# Altium footprint library Pi.PcbLib: 61 footprints (part 2 of 4)
Each footprint in its own frame and in the unit in brackets; x right, y up, seen from the top. Pads: shape width x height; smd on the part's side, far side on the other; paste and mask are expansions set on the pad; w line width, h text height; cw(c..) or ccw(c..) is an arc to the next point about the centre after c.
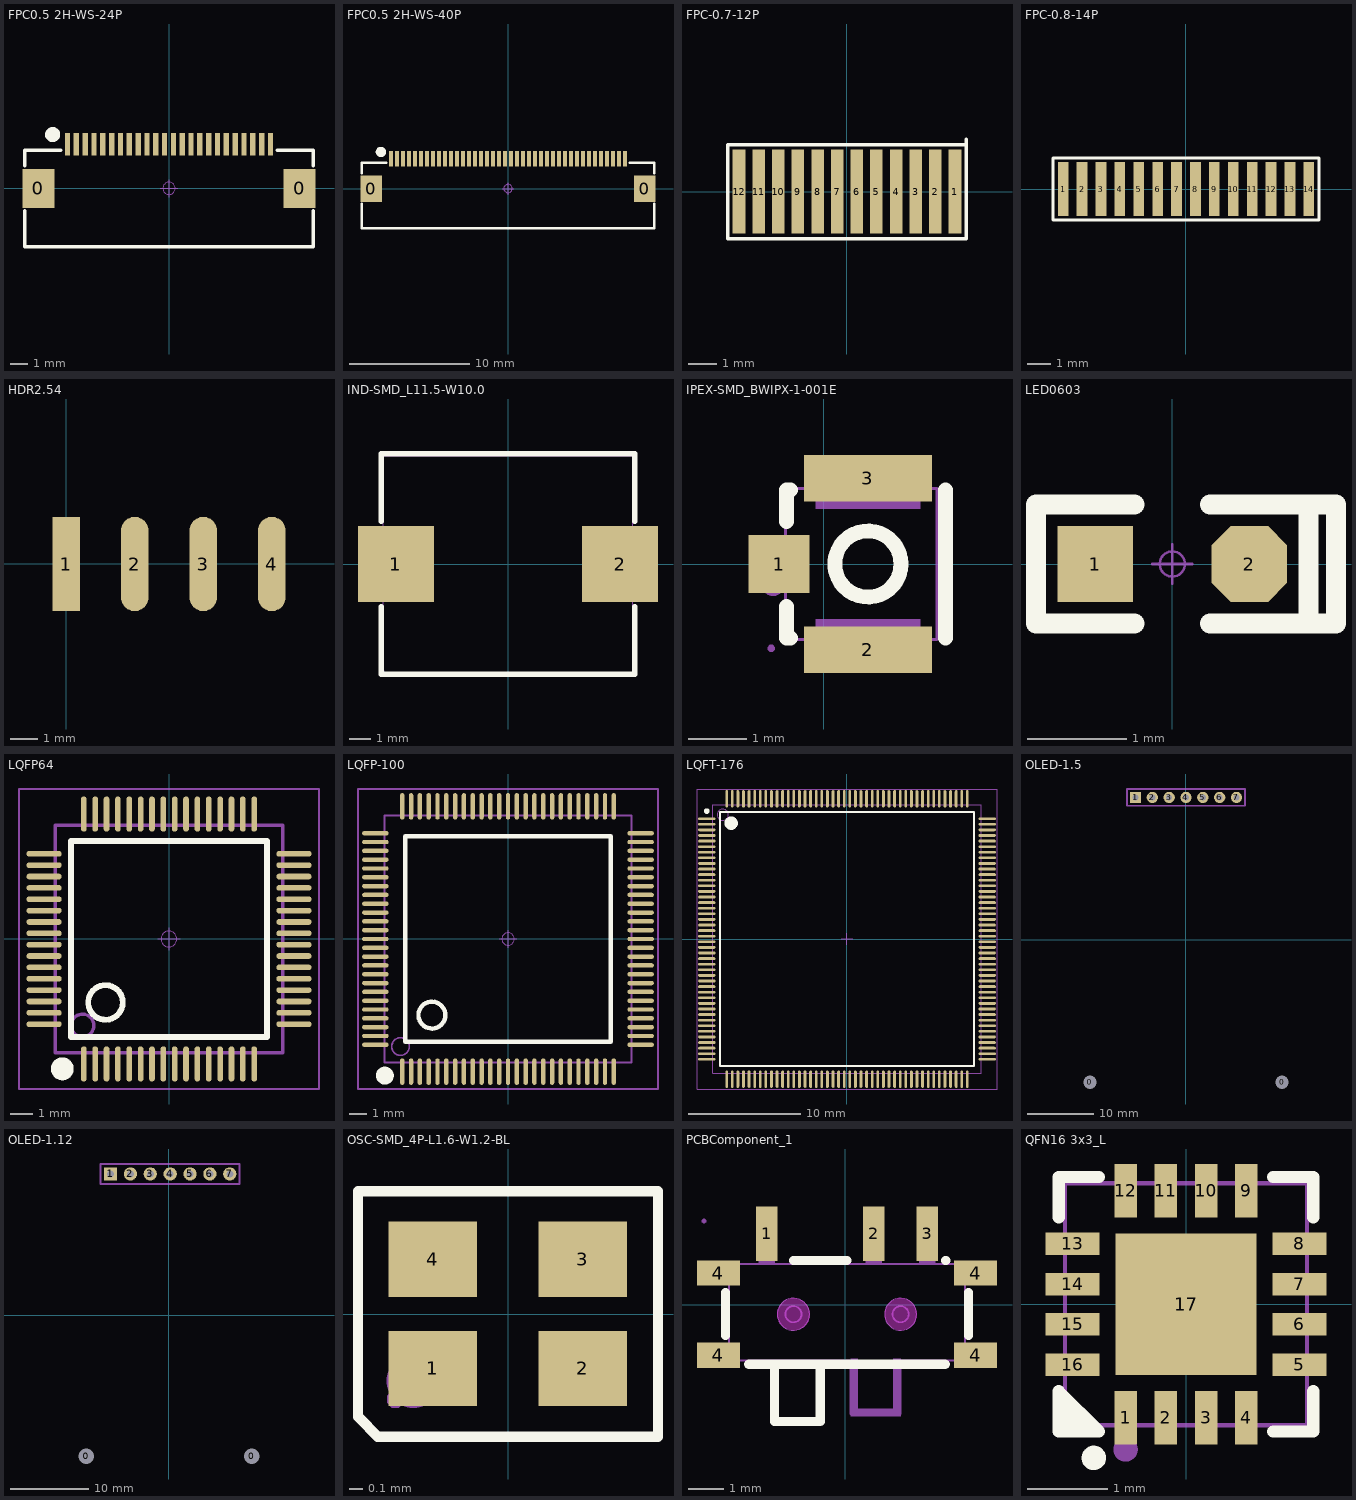
[diagram p1: the footprints below, top view; thin cyan lines are the x and y axes]

## FPC0.5 2H-WS-24P [mm]
pads (26):
  rect 1.8x2.2 smd: 0(-7.4,0) 0(7.4,0)
  rect 0.3x1.3 smd: 1(-5.75,2.497) 2(-5.25,2.497) 3(-4.75,2.497) 4(-4.25,2.497) 5(-3.75,2.497) 6(-3.25,2.497) 7(-2.75,2.497) 8(-2.25,2.497) 9(-1.75,2.497) 10(-1.25,2.497) 11(-0.75,2.497) 12(-0.25,2.497) 13(0.25,2.497) 14(0.75,2.497) 15(1.25,2.497) 16(1.75,2.497) 17(2.25,2.497) 18(2.75,2.497) 19(3.25,2.497) 20(3.75,2.497) 21(4.25,2.497) 22(4.75,2.497) 23(5.25,2.497) 24(5.75,2.497)
Top Overlay:
  circle w0.5: c-6.594,3.048 r0.18
  lines w0.2: -8.175,-1.27 -8.175,-3.302 8.175,-3.302 8.175,-1.27 ; -8.175,1.27 -8.175,2.159 -6.143,2.159 ; 6.143,2.159 8.175,2.159 8.175,1.27
Mechanical 15:
  circle w0.05: c0,0 r0.35
  lines w0.05: -0.5,0 0.5,0 ; 0,-0.5 0,0.5
3D body "FPC0.5_2H-S-W-24P.STEP": height 2, standoff -0.01, extent -8.1,-3.15 8.1,2.85

## FPC0.5 2H-WS-40P [mm]
pads (42):
  rect 1.8x2.2 smd: 0(-11.4,0) 0(11.4,0)
  rect 0.3x1.3 smd: 1(-9.75,2.497) 2(-9.25,2.497) 3(-8.75,2.497) 4(-8.25,2.497) 5(-7.75,2.497) 6(-7.25,2.497) 7(-6.75,2.497) 8(-6.25,2.497) 9(-5.75,2.497) 10(-5.25,2.497) 11(-4.75,2.497) 12(-4.25,2.497) 13(-3.75,2.497) 14(-3.25,2.497) 15(-2.75,2.497) 16(-2.25,2.497) 17(-1.75,2.497) 18(-1.25,2.497) 19(-0.75,2.497) 20(-0.25,2.497) 21(0.25,2.497) 22(0.75,2.497) 23(1.25,2.497) 24(1.75,2.497) 25(2.25,2.497) 26(2.75,2.497) 27(3.25,2.497) 28(3.75,2.497) 29(4.25,2.497) 30(4.75,2.497) 31(5.25,2.497) 32(5.75,2.497) 33(6.25,2.497) 34(6.75,2.497) 35(7.25,2.497) 36(7.75,2.497) 37(8.25,2.497) 38(8.75,2.497) 39(9.25,2.497) 40(9.75,2.497)
Top Overlay:
  circle w0.5: c-10.594,3.048 r0.18
  lines w0.2: -12.175,-1.27 -12.175,-3.302 12.175,-3.302 12.175,-1.27 ; -12.175,1.27 -12.175,2.159 -10.143,2.159 ; 10.143,2.159 12.175,2.159 12.175,1.27
Mechanical 15:
  circle w0.05: c0,0 r0.35
  lines w0.05: -0.5,0 0.5,0 ; 0,-0.5 0,0.5
3D body "FPC0.5_2H-S-W-40P .STEP": height 2, standoff -0.01, extent -12.1,-3.15 12.1,2.85

## FPC-0.7-12P [mm]
pads (12):
  rect 0.45x3 smd: 1(3.85,0) 2(3.15,0) 3(2.45,0) 4(1.75,0) 5(1.05,0) 6(0.35,0) 7(-0.35,0) 8(-1.05,0) 9(-1.75,0) 10(-2.45,0) 11(-3.15,0) 12(-3.85,0)
Top Overlay:
  lines w0.127: 4.256,1.865 4.256,1.676 ; 4.256,1.676 4.256,-1.676 -4.253,-1.676 -4.253,1.676 4.256,1.676

## FPC-0.8-14P [mm]
pads (14):
  rect 0.45x2.3 smd: 1(-5.2,0) 2(-4.4,0) 3(-3.6,0) 4(-2.8,0) 5(-2,0) 6(-1.2,0) 7(-0.4,0) 8(0.4,0) 9(1.2,0) 10(2,0) 11(2.8,0) 12(3.6,0) 13(4.4,0) 14(5.2,0)
Top Overlay:
  lines w0.127: -5.626,-1.321 -5.626,1.321 5.626,1.321 5.626,-1.321 -5.626,-1.321
3D body "LCD_1.44.STEP": height 2.3, standoff 0.04, extent -14.75,-28.626 14.75,7.874

## HDR2.54 [mm]
pads (4):
  rect 1.02x3.5 smd: 1(0,0)
  oval 1.02x3.5 smd: 2(2.54,0) 3(5.08,0) 4(7.62,0)
3D body "HDR2.54-1P.STEP": height 0.57, standoff -1.97, extent 6.35,-1.349 8.89,10.151
3D body "HDR2.54-1P.STEP": height 0.57, standoff -1.97, extent 3.81,-1.349 6.35,10.151
3D body "HDR2.54-1P.STEP": height 0.57, standoff -1.97, extent 1.27,-1.349 3.81,10.151
3D body "HDR2.54-1P.STEP": height 0.57, standoff -1.97, extent -1.27,-1.349 1.27,10.151

## IND-SMD_L11.5-W10.0 [mm]
pads (2):
  rect 3.5x3.5 smd mask+0.051: 1(-5.177,0) 2(5.177,0)
Top Overlay:
  lines w0.254: -5.842,-1.981 -5.842,-5.08 5.842,-5.08 5.842,-1.981 ; -5.842,1.981 -5.842,5.08 5.842,5.08 5.842,1.981
Mechanical 15:
  region: 3.749,1.501 5.751,1.501 5.751,-1.501 3.749,-1.501
  region: -5.751,1.501 -3.749,1.501 -3.749,-1.501 -5.751,-1.501
  region: -5.69,-4.999 -5.69,-4.973 -5.725,-4.938 -5.776,-4.938 -5.812,-4.973 -5.812,-4.999 -5.812,-5.024 -5.776,-5.06 -5.725,-5.06 -5.69,-5.024
  lines w0.051: -5.751,-4.999 5.751,-4.999 5.751,5.001 -5.751,5.001 -5.751,-4.999
3D body "IND-SMD_L11.5-W10.0.STEP": height 4.18, standoff 0.05, extent -5.75,-5.192 5.75,5.309

## IPEX-SMD_BWIPX-1-001E [mm]
pads (3):
  rect 1.05x1 smd mask+0.051: 1(-0.763,0)
  rect 2.2x0.8 smd mask+0.051: 2(0.763,-1.475) 3(0.763,1.475)
Top Overlay:
  circle w0.254: c0.762,0 r0.568
  lines w0.254: -0.635,-0.731 -0.635,-1.27 -0.569,-1.27 ; -0.635,0.731 -0.635,1.27 -0.569,1.27 ; 2.094,-1.27 2.094,1.27
Mechanical 6:
  circle w0.2: c-0.865,-0.349 r0.1
Mechanical 15:
  region: -0.84,-1.45 -0.84,-1.425 -0.875,-1.39 -0.925,-1.39 -0.96,-1.425 -0.96,-1.45 -0.96,-1.475 -0.925,-1.51 -0.875,-1.51 -0.84,-1.475
  region: -0.4,0.3 -0.4,-0.3 -0.9,-0.3 -0.9,0.3
  region: 1.663,0.95 -0.137,0.95 -0.137,1.45 1.663,1.45
  region: 1.663,-1.45 -0.137,-1.45 -0.137,-0.95 1.663,-0.95
  lines w0.051: -0.65,-1.3 1.95,-1.3 1.95,1.3 -0.65,1.3 -0.65,-1.3
3D body "IPX座.STEP": height 1.26, standoff 0, extent -0.788,-1.475 2.313,1.525

## LED0603 [mil] "0603LED"
pads (2):
  rect 30x30 smd: 1(-30.59,0)
  oct 30x30 smd: 2(30.59,0)
Top Overlay:
  lines w8: -15,-23.62 -54.13,-23.62 -54.13,23.62 -15,23.62 ; 15,-23.62 65,-23.62 65,23.62 15,23.62 ; 54.13,-23.62 54.13,23.62
Mechanical 15:
  circle w1: c0,0 r5
  lines w1: -7.87,0 7.87,0 ; 0,-7.87 0,7.88
3D body "LED 0603玻璃罩.STEP": height 23.82, standoff 8.07, extent -23.62,-15.74 23.63,15.75
3D body "LED_0603-B.STEP": height 18.33, standoff -0.04, extent -31.5,-15.79 31.49,15.79

## LQFP64 [mm]
pads (64):
  oval 0.25x1.55 smd: 1(-3.75,-5.5) 2(-3.25,-5.5) 3(-2.75,-5.5) 4(-2.25,-5.5) 5(-1.75,-5.5) 6(-1.25,-5.5) 7(-0.75,-5.5) 8(-0.25,-5.5) 9(0.25,-5.5) 10(0.75,-5.5) 11(1.25,-5.5) 12(1.75,-5.5) 13(2.25,-5.5) 14(2.75,-5.5) 15(3.25,-5.5) 16(3.75,-5.5) 33(3.75,5.499) 34(3.25,5.499) 35(2.75,5.499) 36(2.25,5.499) 37(1.75,5.499) 38(1.25,5.499) 39(0.75,5.499) 40(0.25,5.499) 41(-0.25,5.499) 42(-0.75,5.499) 43(-1.25,5.499) 44(-1.75,5.499) 45(-2.25,5.499) 46(-2.75,5.499) 47(-3.25,5.499) 48(-3.75,5.499)
  oval 1.55x0.25 smd: 17(5.5,-3.75) 18(5.5,-3.25) 19(5.5,-2.75) 20(5.5,-2.25) 21(5.5,-1.75) 22(5.5,-1.25) 23(5.5,-0.75) 24(5.5,-0.25) 25(5.5,0.25) 26(5.5,0.75) 27(5.5,1.25) 28(5.5,1.75) 29(5.5,2.25) 30(5.5,2.75) 31(5.5,3.25) 32(5.5,3.75) 49(-5.499,3.75) 50(-5.499,3.25) 51(-5.499,2.75) 52(-5.499,2.25) 53(-5.499,1.75) 54(-5.499,1.25) 55(-5.499,0.75) 56(-5.499,0.25) 57(-5.499,-0.25) 58(-5.499,-0.75) 59(-5.499,-1.25) 60(-5.499,-1.75) 61(-5.499,-2.25) 62(-5.499,-2.75) 63(-5.499,-3.25) 64(-5.499,-3.75)
Top Overlay:
  circle w0.254: c-2.794,-2.794 r0.762
  circle w0.508: c-4.699,-5.715 r0.25
  lines w0.254: -4.318,-4.318 -4.318,4.318 4.318,4.318 4.318,-4.318 -4.318,-4.318
Mechanical 13:
  circle w0.15: c-3.81,-3.81 r0.5
  lines w0.15: -5,-5 -5,5 5,5 5,-5 -5,-5
Mechanical 15:
  circle w0.05: c0,0 r0.35
  lines w0.05: -0.5,0 0.5,0 ; 0,-0.5 0,0.5
  lines w0.1: -6.604,-6.604 -6.604,6.604 6.604,6.604 6.604,-6.604 -6.604,-6.604
3D body "LQFP64-10x10.STEP": height 1.45, standoff 0, extent -6.003,-6.003 6.003,6.003

## LQFP-100 [mm]
pads (100):
  oval 0.25x1.5 smd: 1(-6,-7.525) 2(-5.5,-7.525) 3(-5,-7.525) 4(-4.5,-7.525) 5(-4,-7.525) 6(-3.5,-7.525) 7(-3,-7.525) 8(-2.5,-7.525) 9(-2,-7.525) 10(-1.5,-7.525) 11(-1,-7.525) 12(-0.5,-7.525) 13(0,-7.525) 14(0.5,-7.525) 15(1,-7.525) 16(1.5,-7.525) 17(2,-7.525) 18(2.5,-7.525) 19(3,-7.525) 20(3.5,-7.525) 21(4,-7.525) 22(4.5,-7.525) 23(5,-7.525) 24(5.5,-7.525) 25(6,-7.525) 51(6,7.525) 52(5.5,7.525) 53(5,7.525) 54(4.5,7.525) 55(4,7.525) 56(3.5,7.525) 57(3,7.525) 58(2.5,7.525) 59(2,7.525) 60(1.5,7.525) 61(1,7.525) 62(0.5,7.525) 63(0,7.525) 64(-0.5,7.525) 65(-1,7.525) 66(-1.5,7.525) 67(-2,7.525) 68(-2.5,7.525) 69(-3,7.525) 70(-3.5,7.525) 71(-4,7.525) 72(-4.5,7.525) 73(-5,7.525) 74(-5.5,7.525) 75(-6,7.525)
  oval 1.5x0.25 smd: 26(7.525,-6) 27(7.525,-5.5) 28(7.525,-5) 29(7.525,-4.5) 30(7.525,-4) 31(7.525,-3.5) 32(7.525,-3) 33(7.525,-2.5) 34(7.525,-2) 35(7.525,-1.5) 36(7.525,-1) 37(7.525,-0.5) 38(7.525,0) 39(7.525,0.5) 40(7.525,1) 41(7.525,1.5) 42(7.525,2) 43(7.525,2.5) 44(7.525,3) 45(7.525,3.5) 46(7.525,4) 47(7.525,4.5) 48(7.525,5) 49(7.525,5.5) 50(7.525,6) 76(-7.525,6) 77(-7.525,5.5) 78(-7.525,5) 79(-7.525,4.5) 80(-7.525,4) 81(-7.525,3.5) 82(-7.525,3) 83(-7.525,2.5) 84(-7.525,2) 85(-7.525,1.5) 86(-7.525,1) 87(-7.525,0.5) 88(-7.525,0) 89(-7.525,-0.5) 90(-7.525,-1) 91(-7.525,-1.5) 92(-7.525,-2) 93(-7.525,-2.5) 94(-7.525,-3) 95(-7.525,-3.5) 96(-7.525,-4) 97(-7.525,-4.5) 98(-7.525,-5) 99(-7.525,-5.5) 100(-7.525,-6)
Top Overlay:
  circle w0.254: c-4.318,-4.318 r0.762
  circle w0.508: c-6.985,-7.747 r0.25
  lines w0.254: -5.842,-5.842 5.842,-5.842 5.842,5.842 -5.842,5.842 -5.842,-5.842
Mechanical 13:
  circle w0.1: c-6.1,-6.1 r0.5
  lines w0.1: -7,-7 7,-7 7,7 -7,7 -7,-7
Mechanical 15:
  circle w0.05: c0,0 r0.35
  lines w0.05: -0.5,0 0.5,0 ; 0,-0.5 0,0.5
  lines w0.1: -8.509,-8.509 8.509,-8.509 8.509,8.509 -8.509,8.509 -8.509,-8.509
3D body "LQFP100-14x14.STEP": height 1.45, standoff 0, extent -8.003,-8.003 8.003,8.003

## LQFT-176 [mm]
pads (176):
  oval 1.55x0.25 smd: 1(-12.525,10.75) 2(-12.525,10.25) 3(-12.525,9.75) 4(-12.525,9.25) 5(-12.525,8.75) 6(-12.525,8.25) 7(-12.525,7.75) 8(-12.525,7.25) 9(-12.525,6.75) 10(-12.525,6.25) 11(-12.525,5.75) 12(-12.525,5.25) 13(-12.525,4.75) 14(-12.525,4.25) 15(-12.525,3.75) 16(-12.525,3.25) 17(-12.525,2.75) 18(-12.525,2.25) 19(-12.525,1.75) 20(-12.525,1.25) 21(-12.525,0.75) 22(-12.525,0.25) 23(-12.525,-0.25) 24(-12.525,-0.75) 25(-12.525,-1.25) 26(-12.525,-1.75) 27(-12.525,-2.25) 28(-12.525,-2.75) 29(-12.525,-3.25) 30(-12.525,-3.75) 31(-12.525,-4.25) 32(-12.525,-4.75) 33(-12.525,-5.25) 34(-12.525,-5.75) 35(-12.525,-6.25) 36(-12.525,-6.75) 37(-12.525,-7.25) 38(-12.525,-7.75) 39(-12.525,-8.25) 40(-12.525,-8.75) 41(-12.525,-9.25) 42(-12.525,-9.75) 43(-12.525,-10.25) 44(-12.525,-10.75) 89(12.525,-10.75) 90(12.525,-10.25) 91(12.525,-9.75) 92(12.525,-9.25) 93(12.525,-8.75) 94(12.525,-8.25) 95(12.525,-7.75) 96(12.525,-7.25) 97(12.525,-6.75) 98(12.525,-6.25) 99(12.525,-5.75) 100(12.525,-5.25) 101(12.525,-4.75) 102(12.525,-4.25) 103(12.525,-3.75) 104(12.525,-3.25) 105(12.525,-2.75) 106(12.525,-2.25) 107(12.525,-1.75) 108(12.525,-1.25) 109(12.525,-0.75) 110(12.525,-0.25) 111(12.525,0.25) 112(12.525,0.75) 113(12.525,1.25) 114(12.525,1.75) 115(12.525,2.25) 116(12.525,2.75) 117(12.525,3.25) 118(12.525,3.75) 119(12.525,4.25) 120(12.525,4.75) 121(12.525,5.25) 122(12.525,5.75) 123(12.525,6.25) 124(12.525,6.75) 125(12.525,7.25) 126(12.525,7.75) 127(12.525,8.25) 128(12.525,8.75) 129(12.525,9.25) 130(12.525,9.75) 131(12.525,10.25) 132(12.525,10.75)
  oval 0.25x1.55 smd: 45(-10.75,-12.525) 46(-10.25,-12.525) 47(-9.75,-12.525) 48(-9.25,-12.525) 49(-8.75,-12.525) 50(-8.25,-12.525) 51(-7.75,-12.525) 52(-7.25,-12.525) 53(-6.75,-12.525) 54(-6.25,-12.525) 55(-5.75,-12.525) 56(-5.25,-12.525) 57(-4.75,-12.525) 58(-4.25,-12.525) 59(-3.75,-12.525) 60(-3.25,-12.525) 61(-2.75,-12.525) 62(-2.25,-12.525) 63(-1.75,-12.525) 64(-1.25,-12.525) 65(-0.75,-12.525) 66(-0.25,-12.525) 67(0.25,-12.525) 68(0.75,-12.525) 69(1.25,-12.525) 70(1.75,-12.525) 71(2.25,-12.525) 72(2.75,-12.525) 73(3.25,-12.525) 74(3.75,-12.525) 75(4.25,-12.525) 76(4.75,-12.525) 77(5.25,-12.525) 78(5.75,-12.525) 79(6.25,-12.525) 80(6.75,-12.525) 81(7.25,-12.525) 82(7.75,-12.525) 83(8.25,-12.525) 84(8.75,-12.525) 85(9.25,-12.525) 86(9.75,-12.525) 87(10.25,-12.525) 88(10.75,-12.525) 133(10.75,12.525) 134(10.25,12.525) 135(9.75,12.525) 136(9.25,12.525) 137(8.75,12.525) 138(8.25,12.525) 139(7.75,12.525) 140(7.25,12.525) 141(6.75,12.525) 142(6.25,12.525) 143(5.75,12.525) 144(5.25,12.525) 145(4.75,12.525) 146(4.25,12.525) 147(3.75,12.525) 148(3.25,12.525) 149(2.75,12.525) 150(2.25,12.525) 151(1.75,12.525) 152(1.25,12.525) 153(0.75,12.525) 154(0.25,12.525) 155(-0.25,12.525) 156(-0.75,12.525) 157(-1.25,12.525) 158(-1.75,12.525) 159(-2.25,12.525) 160(-2.75,12.525) 161(-3.25,12.525) 162(-3.75,12.525) 163(-4.25,12.525) 164(-4.75,12.525) 165(-5.25,12.525) 166(-5.75,12.525) 167(-6.25,12.525) 168(-6.75,12.525) 169(-7.25,12.525) 170(-7.75,12.525) 171(-8.25,12.525) 172(-8.75,12.525) 173(-9.25,12.525) 174(-9.75,12.525) 175(-10.25,12.525) 176(-10.75,12.525)
Top Overlay:
  circle w0.6: c-10.35,10.35 r0.3
  circle w0.25: c-12.525,11.425 r0.125
  lines w0.2: -11.35,-11.35 11.35,-11.35 11.35,11.35 -11.35,11.35 -11.35,-11.35
Mechanical 13:
  circle w0.1: c-11.1,11.1 r0.5
  lines w0.1: -12,-12 12,-12 12,12 -12,12 -12,-12
Mechanical 15:
  lines w0.05: -13.4,-13.4 13.4,-13.4 13.4,13.4 -13.4,13.4 -13.4,-13.4
  lines w0.1: -0.5,0 0.5,0 ; 0,-0.5 0,0.5
3D body "LQFP176-24x24.STEP": height 1.45, standoff 0, extent -13.003,-13.003 13.003,13.003

## OLED-1.5 [mm]
pads (9):
  round 1.524 hole 2: 0(-14.5,-21.5) 0(14.5,-21.5)
  rect 1.7x1.7 hole 0.9: 1(-7.62,21.5)
  round 1.7 hole 0.9: 2(-5.08,21.5) 3(-2.54,21.5) 4(0,21.5) 5(2.54,21.5) 6(5.08,21.5) 7(7.62,21.5)
Mechanical 1:
  lines w0.254: -8.89,20.23 8.89,20.23 8.89,22.77 -8.89,22.77 -8.89,20.23
3D body "OLED-1.5.STEP": height 12.61, standoff 1, extent -17.025,-23.988 16.975,23.012

## OLED-1.12 [mm]
pads (9):
  round 1.524 hole 2: 0(-10.6,-18.041) 0(10.6,-18.041)
  rect 1.7x1.7 hole 0.9: 1(-7.47,18.041)
  round 1.7 hole 0.9: 2(-4.93,18.041) 3(-2.39,18.041) 4(0.15,18.041) 5(2.69,18.041) 6(5.23,18.041) 7(7.77,18.041)
Mechanical 1:
  lines w0.254: -8.74,16.771 9.04,16.771 9.04,19.311 -8.74,19.311 -8.74,16.771
3D body "OLED-1.12.STEP": height 13.4, standoff 0, extent -13.052,-20.662 13.148,19.438

## OSC-SMD_4P-L1.6-W1.2-BL [mm]
pads (4):
  rect 0.65x0.551 smd mask+0.051: 1(-0.551,-0.399) 2(0.549,-0.399) 3(0.549,0.401) 4(-0.551,0.401)
Top Overlay:
  lines w0.076: -1.1,-0.754 -1.1,0.899 1.1,0.899 1.1,-0.899 -0.955,-0.899 -1.092,-0.762
Mechanical 6:
  circle w0.201: c-0.691,-0.49 r0.099
Mechanical 15:
  region: -0.765,-0.625 -0.765,-0.6 -0.8,-0.564 -0.851,-0.564 -0.886,-0.6 -0.886,-0.625 -0.886,-0.65 -0.851,-0.686 -0.8,-0.686 -0.765,-0.65
  region: -0.8,-0.15 -0.399,-0.15 -0.249,-0.3 -0.249,-0.599 -0.8,-0.599
  region: 0.8,0.15 0.249,0.15 0.249,0.599 0.8,0.599
  region: 0.249,-0.15 0.8,-0.15 0.8,-0.599 0.249,-0.599
  region: -0.249,0.15 -0.8,0.15 -0.8,0.599 -0.249,0.599
3D body "1612_26MHZ.STEP": height 0.35, standoff 0, extent -0.8,-0.59 0.8,0.61

## PCBComponent_1 [mil]
pads (7):
  rect 23.6x60 smd mask+2: 1(-86.5,78) 2(31.6,78) 3(90.7,78)
  rect 47.2x27.6 smd mask+2: 4(-139.6,-55.8) 4(-139.6,34.7) 4(143.8,-55.8) 4(143.8,34.7)
Top Overlay:
  lines w10: -131.8,-33.9 -131.8,13.3 ; -106.2,-65.7 110.4,-65.7 ; -77.6,-65.7 -77.6,-128.7 -27.4,-128.7 -27.4,-65.7 ; -57,48.5 2.1,48.5 ; 110.7,48.5 111.1,48.5 ; 136,-33.9 136,13.3
Keep-Out Layer:
  board cut-out: 78.9,-10.6 78.9,-7.08 76.21,-0.57 71.23,4.41 64.72,7.1 57.68,7.1 51.17,4.41 46.19,-0.57 43.5,-7.08 43.5,-10.6 43.5,-14.12 46.19,-20.63 51.17,-25.61 57.68,-28.3 64.72,-28.3 71.23,-25.61 76.21,-20.63 78.9,-14.12
  board cut-out: -39.2,-10.6 -39.2,-7.08 -41.89,-0.57 -46.87,4.41 -53.38,7.1 -60.42,7.1 -66.93,4.41 -71.91,-0.57 -74.6,-7.08 -74.6,-10.6 -74.6,-14.12 -71.91,-20.63 -66.93,-25.61 -60.42,-28.3 -53.38,-28.3 -46.87,-25.61 -41.89,-20.63 -39.2,-14.12
Mechanical 1:
  circle w0.2: c61.2,-10.6 r17.7
  circle w0.2: c-56.9,-10.6 r17.7
Mechanical 6:
  region: 6,-65.7 6,-122.8 61.2,-122.8 61.2,-59.8 53.3,-59.8 53.3,-114.9 13.9,-114.9 13.9,-59.8 6,-59.8
Mechanical 15:
  circle w2: c61.2,-10.6 r8.9
  circle w2: c-56.9,-10.6 r8.9
  region: 81.8,52.7 81.8,92 99.5,92 99.5,52.7
  region: 81.8,44.4 81.8,53.1 99.5,53.1 99.5,44.4
  region: 22.8,52.7 22.8,92 40.5,92 40.5,52.7
  region: 22.8,44.4 22.8,53.1 40.5,53.1 40.5,44.4
  region: -95.3,52.7 -95.3,92 -77.6,92 -77.6,52.7
  region: -95.3,44.4 -95.3,53.1 -77.6,53.1 -77.6,44.4
  region: 159.6,-61 130.1,-61 130.1,-43.3 159.6,-43.3
  region: 159.6,25.9 130,25.9 130,43.6 159.6,43.6
  region: -125.9,-61 -155.4,-61 -155.4,-43.3 -125.9,-43.3
  region: -125.9,25.9 -155.4,25.9 -155.4,43.6 -125.9,43.6
  region: -153,92 -153,92.99 -154.41,94.4 -156.39,94.4 -157.8,92.99 -157.8,92 -157.8,91.01 -156.39,89.6 -154.41,89.6 -153,91.01
  lines w2: -127.8,-61.5 -127.8,44.8 132,44.8 132,-61.5 61.2,-61.5 61.2,-120.6 33.6,-120.6 6,-120.6 6,-61.5 -127.8,-61.5

## QFN16 3x3_L [mil] "16脚"
pads (17):
  rect 11x26.2 smd mask+2: 1(-29.5,-55.4) 2(-9.8,-55.4) 3(9.8,-55.4) 4(29.5,-55.4) 9(29.5,55.4) 10(9.8,55.4) 11(-9.8,55.4) 12(-29.5,55.4)
  rect 26.2x11 smd mask+2: 5(55.4,-29.5) 6(55.4,-9.8) 7(55.4,9.8) 8(55.4,29.5) 13(-55.4,29.5) 14(-55.4,9.8) 15(-55.4,-9.8) 16(-55.4,-29.5)
  rect 68.9x68.9 smd mask+2: 17(0,0)
Top Overlay:
  circle w5.9: c-45,-75 r3
  region: -60,-62.1 -60,-45 -45,-62.1 -60,-62.1
  lines w6: -62.1,42.5 -62.1,62.1 -42.5,62.1 ; 42.5,-62.1 62.1,-62.1 62.1,-42.5 ; 42.5,62.1 62.1,62.1 62.1,42.5 ; -62.1,-62.1 -42.5,-62.1 -62.1,-42.5 -62.1,-62.1
Mechanical 6:
  circle w5.9: c-29.5,-70.9 r3
Mechanical 15:
  region: -33.5,33.5 33.5,33.5 33.5,-33.5 -33.5,-33.5
  region: -43.3,-33.6 -43.3,-25.5 -59.1,-25.5 -59.1,-33.6
  region: -43.3,-13.9 -43.3,-5.8 -59.1,-5.8 -59.1,-13.9
  region: -43.3,5.8 -43.3,13.9 -59.1,13.9 -59.1,5.8
  region: -43.3,25.5 -43.3,33.6 -59.1,33.6 -59.1,25.5
  region: -33.6,59.1 -33.6,43.3 -25.5,43.3 -25.5,59.1
  region: -13.9,59.1 -13.9,43.3 -5.8,43.3 -5.8,59.1
  region: 5.8,59.1 5.8,43.3 13.9,43.3 13.9,59.1
  region: 25.5,59.1 25.5,43.3 33.6,43.3 33.6,59.1
  region: 43.3,25.5 43.3,33.6 59.1,33.6 59.1,25.5
  region: 43.3,5.8 43.3,13.9 59.1,13.9 59.1,5.8
  region: 43.3,-13.9 43.3,-5.8 59.1,-5.8 59.1,-13.9
  region: 43.3,-33.6 43.3,-25.5 59.1,-25.5 59.1,-33.6
  region: 25.5,-59.1 25.5,-43.3 33.6,-43.3 33.6,-59.1
  region: 5.8,-59.1 5.8,-43.3 13.9,-43.3 13.9,-59.1
  region: -13.9,-59.1 -13.9,-43.3 -5.8,-43.3 -5.8,-59.1
  region: -33.6,-59.1 -33.6,-43.3 -25.5,-43.3 -25.5,-59.1
  region: -56.7,-59.1 -56.7,-58.11 -58.11,-56.7 -60.09,-56.7 -61.5,-58.11 -61.5,-59.1 -61.5,-60.09 -60.09,-61.5 -58.11,-61.5 -56.7,-60.09
  lines w2: -59.1,-59.1 59.1,-59.1 59.1,59.1 -59.1,59.1 -59.1,-59.1
3D body "QFN16L-3X3.STEP": height 16.03, standoff -0.39, extent -59.05,-59.1 59.05,59